# Altium footprint library Arduino.PcbLib: 1 footprints
Each footprint in its own frame and in the unit in brackets; x right, y up, seen from the top. Pads: shape width x height; smd on the part's side, far side on the other; paste and mask are expansions set on the pad; w line width, h text height; cw(c..) or ccw(c..) is an arc to the next point about the centre after c.
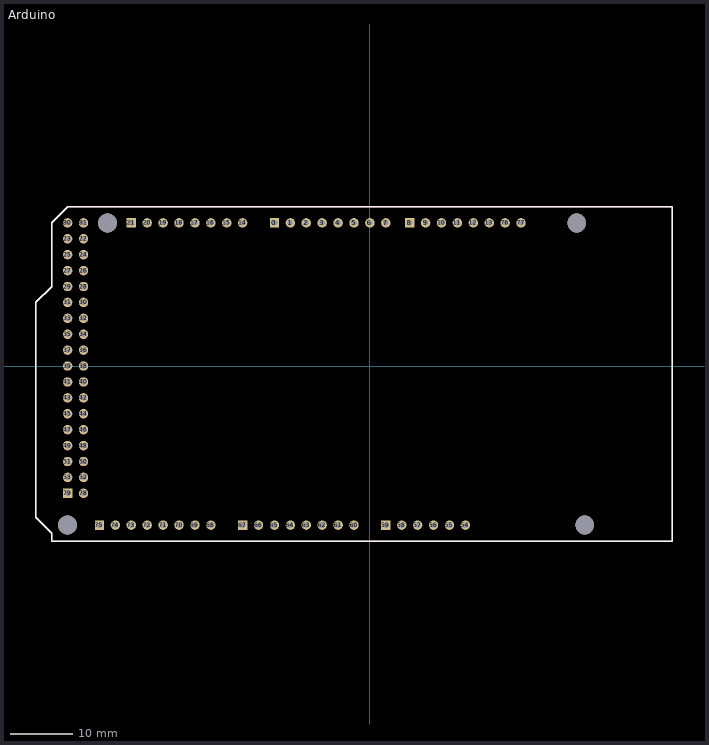
[diagram p0: the footprint, top view; thin cyan lines are the x and y axes]

## Arduino [mm] "Arduino Mega 2560"
pads (82):
  rect 1.5x1.5 hole 0.9: 0(-15.24,22.86) 8(6.35,22.86) 21(-38.1,22.86) 59(2.54,-25.4) 67(-20.32,-25.4) 75(-43.18,-25.4) 79(-48.26,-20.32)
  round 1.5 hole 0.9: 1(-12.7,22.86) 2(-10.16,22.86) 3(-7.62,22.86) 4(-5.08,22.86) 5(-2.54,22.86) 6(0,22.86) 7(2.54,22.86) 9(8.89,22.86) 10(11.43,22.86) 11(13.97,22.86) 12(16.51,22.86) 13(19.05,22.86) 14(-20.32,22.86) 15(-22.86,22.86) 16(-25.4,22.86) 17(-27.94,22.86) 18(-30.48,22.86) 19(-33.02,22.86) 20(-35.56,22.86) 22(-45.72,20.32) 23(-48.26,20.32) 24(-45.72,17.78) 25(-48.26,17.78) 26(-45.72,15.24) 27(-48.26,15.24) 28(-45.72,12.7) 29(-48.26,12.7) 30(-45.72,10.16) 31(-48.26,10.16) 32(-45.72,7.62) 33(-48.26,7.62) 34(-45.72,5.08) 35(-48.26,5.08) 36(-45.72,2.54) 37(-48.26,2.54) 38(-45.72,0) 39(-48.26,0) 40(-45.72,-2.54) 41(-48.26,-2.54) 42(-45.72,-5.08) 43(-48.26,-5.08) 44(-45.72,-7.62) 45(-48.26,-7.62) 46(-45.72,-10.16) 47(-48.26,-10.16) 48(-45.72,-12.7) 49(-48.26,-12.7) 50(-45.72,-15.24) 51(-48.26,-15.24) 52(-45.72,-17.78) 53(-48.26,-17.78) 54(15.24,-25.4) 55(12.7,-25.4) 56(10.16,-25.4) 57(7.62,-25.4) 58(5.08,-25.4) 60(-2.54,-25.4) 61(-5.08,-25.4) 62(-7.62,-25.4) 63(-10.16,-25.4) 64(-12.7,-25.4) 65(-15.24,-25.4) 66(-17.78,-25.4) 68(-25.4,-25.4) 69(-27.94,-25.4) 70(-30.48,-25.4) 71(-33.02,-25.4) 72(-35.56,-25.4) 73(-38.1,-25.4) 74(-40.64,-25.4) 76(21.59,22.86) 77(24.13,22.86) 78(-45.72,-20.32) 80(-48.26,22.86) 81(-45.72,22.86)
via 34.29,-25.4 diameter 3 hole 3
via 33.02,22.86 diameter 3 hole 3
via -41.91,22.86 diameter 3 hole 3
via -48.26,-25.4 diameter 3 hole 3
Top Overlay:
  lines w0.2: -53.34,-24.13 -53.34,10.16 -50.8,12.7 -50.8,22.86 -48.26,25.4 48.26,25.4 48.26,-27.94 -50.8,-27.94 -50.8,-26.67 -53.34,-24.13
Bottom Overlay:
  lines w0.2: -49.53,-21.59 -49.53,24.13 -44.45,24.13 -44.45,-21.59 -49.53,-21.59 ; -44.45,-26.67 -44.45,-24.13 -24.13,-24.13 -24.13,-26.67 -44.45,-26.67 ; -39.37,21.59 -39.37,24.13 -19.05,24.13 -19.05,21.59 -39.37,21.59 ; -21.59,-26.67 -21.59,-24.13 -1.27,-24.13 -1.27,-26.67 -21.59,-26.67 ; -16.51,21.59 -16.51,24.13 3.81,24.13 3.81,21.59 -16.51,21.59 ; 1.27,-26.67 1.27,-24.13 16.51,-24.13 16.51,-26.67 1.27,-26.67 ; 5.08,21.59 5.08,24.13 25.4,24.13 25.4,21.59 5.08,21.59
Mechanical 1:
  lines w0.254: -50.8,12.69 -53.34,10.15 -53.34,-24.13 -50.8,-26.67 -50.8,-27.94 46.62,-27.94 48.26,-27.94 48.26,-26.3 48.26,25.4 -48.26,25.4 -50.8,22.86 -50.8,12.7
Mechanical 29:
  lines w0.2: -53.34,-24.13 -53.34,10.16 -50.8,12.7 -50.8,22.86 -48.26,25.4 48.26,25.4 48.26,-27.94 -50.8,-27.94 -50.8,-26.67 -53.34,-24.13
  text ".Designator" at -11.43,-1.27 h7
3D body "ARDUINO_MEGA2560_REF.STEP": height 12.71, standoff -1.79, extent -53.34,-27.94 54.719,25.4